# Altium schematic symbol library LimeMicroAltiumLib.SchLib: 590 symbols (part 12 of 13) (continued)
## SW_SM_4bit
designator SW?, comment 4 bit switch
Manufacturer Part Number 1: A6H-4101; Manufacturer: Omron Electronics Inc-EMC Div; Pitch: 0.050" (1.27mm), Half; Mechanical Life: 1,000 Cycles; Washable: No; Current Rating: 25mA; Number of Positions: 4; Voltage Rating: 24VDC; Actuator Level: Flush, Recessed; Circuit: SPST; Actuator Type: Slide (Standard); Supplier 1: Digi-Key; Height Above Board: 0.061" (1.55mm); RoHS: RoHS Compliant; Termination Style: Gull Wing; Electrical Life: 1,000 Cycles; Length: 0.248" (6.31mm); Category: Switches; Operating Temperature: -20°C ~ 70°C; Body Material: -; Contact Material: -; Features: -; Mounting Type: Surface Mount; Contact Finish: -; Packaging: Tube; Supplier Part Number 1: SW1080-ND
footprint SW_4WAY_SMD_1P27 (DIP Switch; 8 Leads, 1.27 pitch)
pins: 1 A1, 2 A2, 3 A3, 4 A4, 5 B4, 6 B3, 7 B2, 8 B1

## SW_SM_4bit_v2
designator SW?, comment 4 bit switch
Part Description: Dip Switch SPST Position Through Hole, Right Angle Piano Actuator 25mA 24VDC; Manufacturer: CUI Devices; Manufacturer Part Number 1: DS02C-254-1L-04BE; Supplier 1: Digi-Key; Supplier Part Number 1: 2223-DS02C-254-1L-04BE-ND; Stock 1: 1133; Pricing 1: 1=0,60000, 10=0,58100, 25=0,55920, 100=0,48400, 250=0,44100, 500=0,40874, 1000=0,36572, 2500=0,34636, 5000=0,32054 (USD); RoHS: Yes
footprint DS02C-254-1L-04BE_DIP_SWITCH_4PIN
pins: 1 A1, 2 B1, 3 A2, 4 B2, 5 A3, 6 B3, 7 A4, 8 B4

## SW_SM_8bit
designator SW?, comment 8 bit switch
Manufacturer: Omron Electronics Inc-EMC Div; Manufacturer Part Number: A6H-8101; Actuator Level: Flush; Actuator Type: Standard; Circuit: SPST; Contact Rating @ Voltage: 0.025A @ 24VDC; Number of Positions: 8; Supplier 1: Digi-Key; Mounting Type: Surface Mount; Category: Switches; Supplier Part Number 1: SW1118-ND
footprint SW_8WAY_SMD (DIP Switch; 16 Leads)
pins: 1 A1, 2 A2, 3 A3, 4 A4, 5 A5, 6 A6, 7 A7, 8 A8, 9 B8, 10 B7, 11 B6, 12 B5, 13 B4, 14 B3, 15 B2, 16 B1

## SW_THD_SPDT_On-On
designator S?, comment ON-ON
Switch THD vertical toggle SPDT; Manufacturer 1: TE Connectivity; Manufacturer Part Number 1: SLS121PC04; Contact Rating @ Voltage: 0.25A @ 125VAC; Circuit: SPDT; Mounting Type: PCB mount; Supplier 1: Digi-Key; Supplier Part Number 1: 450-1598-ND; Switch Function: On-On
footprint SWITCH_SPDT_SLIDER (TE Connectivity SLS121PC04 SPDT slider)
footprint SWITCH_SPDT_SLIDER (TE Connectivity SLS121PC04 SPDT slider)
pins: 1, 2, 3

## SW_THD_SPDT_On-On_v2
designator S?, comment ON-ON  (value not drawn)
Switch THD vertical toggle SPDT; Manufacturer Part Number: 1101M2S3CQE2; Manufacturer: C&K Components; Voltage Rating - AC: 120V; Actuator Length: 5.08mm; Current Rating: 6A (AC/DC); Electrical Life: 40,000 Cycles; Switch Travel: 2.16mm; Voltage Rating - DC: 28V; Supplier 1: Digi-Key; Termination Style: PC Pin; Operating Temperature: -30°C ~ 65°C; Category: Switches; Switch Function: On-On; Supplier Part Number 1: CKN5001-ND
footprint SWITCH_SPDT_SLIDER - duplicate (TE Connectivity SLS121PC04 SPDT slider)
pins: 1, 2, 3

## SXBP-29+
designator IC?
Manufacturer: MiniCircuits; Part Description: Bandpass Filter;  50Ω; 24 to 35 MHz; Low insertion loss (0.9dB typical); Manufacturer Part Number 1: SXBP-29+; Supplier Part Number 1: SXBP-29+; Supplier 1: Minicircuits
footprint SXBP-29+
pins: 1 IN (in), 2 GND, 3 GND, 4 GND, 5 GND, 6 GND, 7 GND, 8 OUT (out)

## SYD-20-33+_coupler
designator IC?, comment SYD-20-33+
Directional RF coupler 30 to 3000 MHz
footprint SYD-20-33+
pins: 1 OUT (out), 2 GND, 3 GND, 4 GND, 5 COUPLED OUT (out), 6 GND, 7 GND, 8 IN (in)

## SZA3044Z
designator IC?
Manufacturer: RFMD; Manufacturer Part Number 1: SZA-3044Z; Part Description: RF Amplifier IC 802.16/WiMax, WLL 2.7GHz ~ 3.8GHz 20-QFN (4x4); Gain: 26dB; Frequency: 3.8GHz; P1dB: 30dBm; Noise Figure: 5dB; Operating Supply Current: 240mA; Test Frequency: 3.6GHz; Supplier 1: Digi-Key; Stock 1: 2697; Pricing 1: 1=8,64000, 10=7,92300, 25=7,20320, 100=6,48270, 250=5,94248, 500=5,40226, 1000=4,86203 (USD); RoHS: Yes; Case/Package: QFN; Package Quantity: 1; Packaging: Tape and Reel; ComponentLink1URL: https://datasheet.ciiva.com/26924/sza-3044z-26924889.pdf?src-supplier=IIIC; ComponentLink1Description: https://datasheet.ciiva.com/26924/sza-3044z-26924889.pdf?src-supplier=IIIC; ComponentLink2URL: https://datasheet.ciiva.com/2790/sza3044z-data-sheet-2790248.pdf?src-supplier=Digi-Key; ComponentLink2Description: https://datasheet.ciiva.com/2790/sza3044z-data-sheet-2790248.pdf?src-supplier=Digi-Key; ComponentLink3URL: https://datasheet.ciiva.com/2790/sza3044z-data-sheet-2790249.pdf?src-supplier=Digi-Key; ComponentLink3Description: https://datasheet.ciiva.com/2790/sza3044z-data-sheet-2790249.pdf?src-supplier=Digi-Key; ComponentLink4URL: https://datasheet.ciiva.com/2790/sza3044z-data-sheet-2790250.pdf?src-supplier=Digi-Key; ComponentLink4Description: https://datasheet.ciiva.com/2790/sza3044z-data-sheet-2790250.pdf?src-supplier=Digi-Key; Supplier Part Number 1: 599-1071-1-ND
footprint SZA3044Z_QFN20 (Footprint not found)
pins: 1 NC, 2 NC, 3 RF IN (in), 4 NC, 5 NC, 6 VPC1 (power), 7 NC, 8 VPC2 (power), 9 NC, 10 VDET (out), 11 NC, 12 RF OUT (out), 13 NC, 14 RF OUT (out), 15 NC, 16 VC2 (power), 17 NC, 18 VC1 (power), 19 NC, 20 VBIAS (power), EPAD GND

## TC1-1-13M+
designator T?
Part Description: RF balun; 1:1 ratio; 3 dB bandwidth: 0.1 MHz to 3.5 GHz; 3.8mm x 3.8mm; Supplier 1: Minicircuits; Manufacturer Part Number 1: TC1-1-13M+; Supplier Part Number: TC1-1-13M+
footprint TC1-1-13MA+_v2 (Balun)
pins: 1, 2, 3, 4, 6
text: Primary; Secondary; 1:1

## TC1-1-13M+_TCM1-63AX+
designator T?, comment TC1-1-13M-45+
Part Description: RF balun; 1:1 ratio; 3 dB bandwidth: 0.1 MHz to 3.5 GHz; 3.8mm x 3.8mm; Supplier 1: Minicircuits; Manufacturer Part Number 1: TC1-1-13M-45+; Supplier Part Number: TC1-1-13M-45+
footprint TC1-1-13MA+_JA4220-AL_TCM1-63AX+ (Balun compatible with TC1-1-13MA+, JA4220-AL_ and TCM1-63AX+)
pins: 1, 2, 3, 4, 6
text: Primary; Secondary; 1:1; TCM1-63AX+

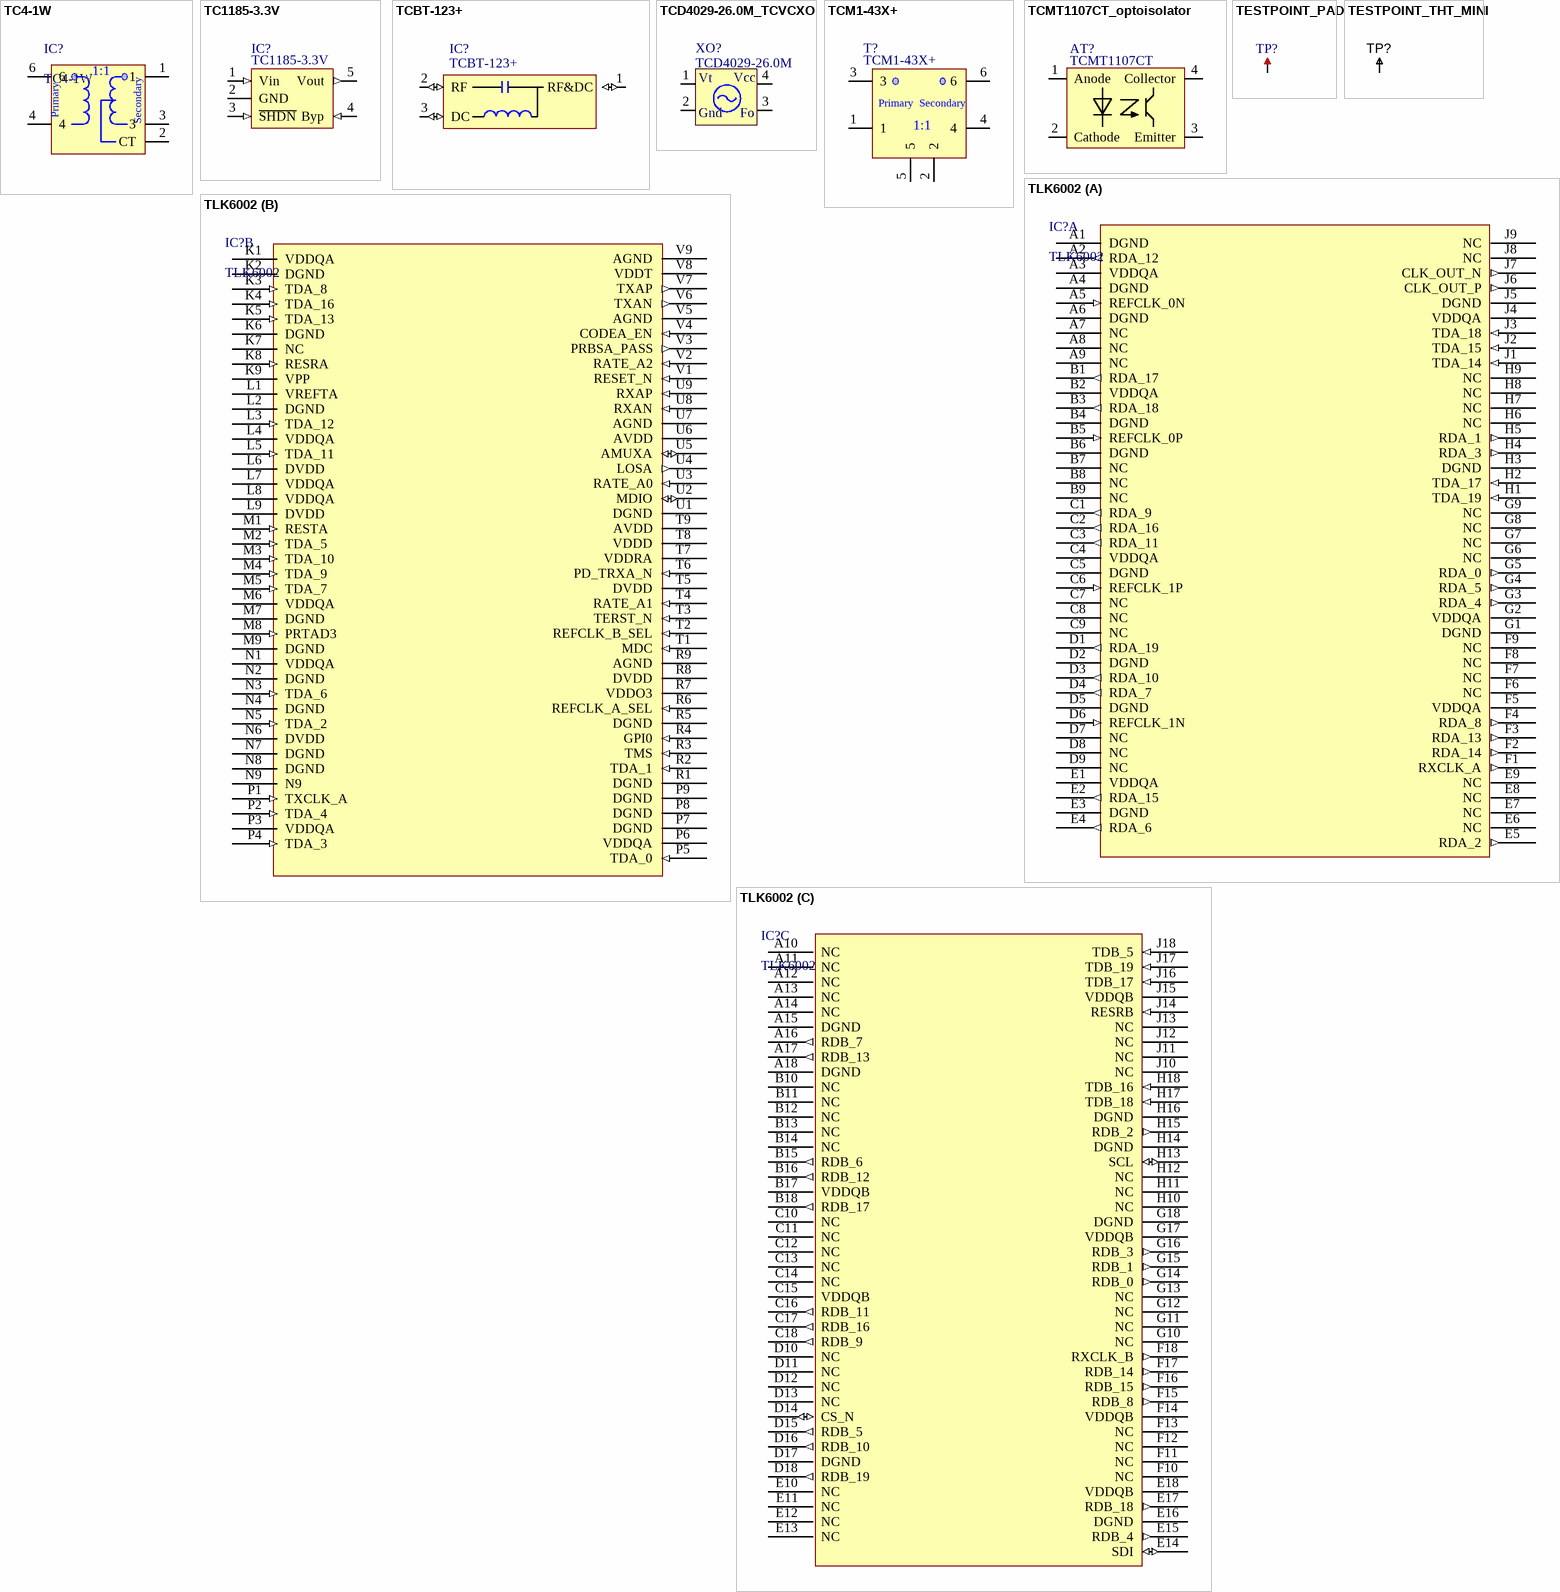
[diagram p65: symbols TC4-1W to TLK6002]

## TC4-1W
designator IC?
Part Description: RF Transformer; 50R, 3 to 800 MHz; with secondary center tap; Manufacturer: Mini-CIrcuits; Manufacturer Part Number 1: TC4-1W; Supplier Part Number 1: TC4-1W; Supplier 1: Mini-Circuits
footprint TC1-1-13MA+_JA4220-AL_ (Balun compatible with TC1-1-13MA+ and JA4220-AL_)
pins: 1, 2 CT, 3, 4, 6
text: 1:1; Primary; Secondary

## TC1185-3.3V
designator IC?
Part Description: IC REG LDO 3.3V 0.15A SOT23-5; Manufacturer: Microchip Technology; Manufacturer Part Number 1: TC1185-3.3VCT713; Regulator Topology: Positive Fixed; Voltage - Output: 3.3V; Current - Output: 150mA; Voltage - Dropout (Typical): 0.27V @ 150mA; Voltage - Input: Up to 6V; Supplier 1: Digi-Key; RoHS: RoHS Compliant; Category: Integrated Circuits (ICs); Stock 1: 24034; Pricing 1: 1=0.38, 25=0.3192, 100=0.2884 (USD); Packaging: Cut Tape (CT); Part Status: Active; Current - Limit (Min): -; Operating Temperature: -40°C ~ 125°C; Mounting Type: Surface Mount; Package / Case: SC-74A, SOT-753; Supplier Device Package: SOT-23-5; ComponentLink1URL: http://www.microchip.com/mymicrochip/filehandler.aspx?ddocname=en011417; ComponentLink1Description: http://www.microchip.com/mymicrochip/filehandler.aspx?ddocname=en011417; Supplier Part Number 1: TC11853.3VCT713CT-ND
footprint SOT23-5
pins: 1 Vin (in), 2 GND, 3 ~{SHDN} (in), 4 Byp (in), 5 Vout (out)

## TCBT-123+
designator IC?
Surface mount bias-tee, wideband; Manufacturer_Name: Mini-Circuits; Manufacturer_Part_Number: TCBT-14+; Supplier Part Number 1: TCBT-14+; Supplier 1: Mini-Circuits; Part Description: Surface mount bias-tee, wideband
footprint TCBT-123+_GU1414
pins: 1 RF&DC (io), 2 RF (io), 3 DC (io), 4 NOT_USED hidden, 5 PAD_1 hidden, 6 PAD_2 hidden

## TCD4029-26.0M_TCVCXO
designator XO?, comment TCD4029-26.0M
pins: 1 Vt (power), 2 GND, 3 Fo, 4 VCC (power)
text: Vcc; Gnd

## TCM1-43X+
designator T?
Also compatible with JA4220-AL_; Part Description: RF balun; 1:1 ratio; 3 dB bandwidth: 10 MHz to 4 GHz; 3.8mm x 3.8mm; Supplier 1: Coilcraft; Manufacturer Part Number 1: TCM1-43X+; Supplier Part Number: TCM1-43X+
footprint TCM1-43X+ (Balun)
pins: 1, 2, 3, 4, 5, 6
text: Primary; Secondary; 1:1

## TCMT1107CT_optoisolator
designator AT?, comment TCMT1107CT
Part Description: Optoisolator Transistor Output 5000Vrms 1 Channel 4-SMD; Manufacturer: Vishay Semiconductors; Reverse Breakdown Voltage: 6V; Max Power Dissipation: 250mW; Number of Channels: 1; Output Voltage: 70V; Forward Voltage: 1.6V; Forward Current: 60mA; Rise Time: 3s; Output Current per Channel: 50mA; Collector Emitter Saturation Voltage: 300mV; Isolation Voltage: 3.75kV; Fall Time: 4.7s; Current Transfer Ratio: 160%; ComponentLink1URL: https://www.verical.com/server-webapp/html/getDatasheet?partID=312696; ComponentLink1Description: https://www.verical.com/server-webapp/html/getDatasheet?partID=312696; ComponentLink2URL: https://www.fairchildsemi.com/datasheets/FO/FOD817A.pdf; ComponentLink2Description: https://www.fairchildsemi.com/datasheets/FO/FOD817A.pdf; ComponentLink3URL: http://www.fairchildsemi.com/ds/FO/FOD817A.pdf; ComponentLink3Description: http://www.fairchildsemi.com/ds/FO/FOD817A.pdf; ComponentLink4URL: http://www.fairchildsemi.com/datasheets/FO/FOD817A.pdf; ComponentLink4Description: http://www.fairchildsemi.com/datasheets/FO/FOD817A.pdf; ComponentLink5URL: http://www.mouser.com/ds/2/149/FOD817A-194238.pdf; ComponentLink5Description: http://www.mouser.com/ds/2/149/FOD817A-194238.pdf; ComponentLink6URL: https://www.fairchildsemi.com/datasheets/FO/FOD817D.pdf; ComponentLink6Description: https://www.fairchildsemi.com/datasheets/FO/FOD817D.pdf; Supplier 1: Digi-Key; Manufacturer Part Number 1: TCMT1107; Stock 1: 139303; Pricing 1: 1=0.75, 10=0.585, 25=0.4848, 100=0.418, 250=0.36784, 500=0.31768, 1000=0.2508 (USD); Mount: PCB,Surface Mount; Case/Package: SOP; Number of Pins: 4; Contact Plating: Matte,Tin; Min Operating Temperature: -40°C; Max Operating Temperature: 100°C; Packaging: Tape and Reel; Package Quantity: 1; Collector Emitter Voltage (VCEO): 70V; Max Output Voltage: 70V; Max Collector Current: 50mA; Reverse Voltage (DC): 6V; Number of Elements: 1; Power Dissipation: 250mW; Max Input Current: 60mA; Collector Emitter Breakdown Voltage: 70V; Input Current: 50mA; Voltage Rating (DC): 70V; Voltage: 6V; Radiation Hardening: No; REACH SVHC: No SVHC; Lead Free: Lead Free; ComponentLink7URL: http://www.jameco.com/Jameco/Products/ProdDS/1107109.pdf; ComponentLink7Description: http://www.jameco.com/Jameco/Products/ProdDS/1107109.pdf; ComponentLink8URL: http://www.vishay.com/docs/83510/tcmt1100.pdf; ComponentLink8Description: http://www.vishay.com/docs/83510/tcmt1100.pdf; ComponentLink9URL: http://www.mouser.com/ds/2/427/tcmt1100-103040.pdf; ComponentLink9Description: http://www.mouser.com/ds/2/427/tcmt1100-103040.pdf; ComponentLink10URL: http://www.farnell.com/datasheets/485045.pdf; ComponentLink10Description: http://www.farnell.com/datasheets/485045.pdf; Supplier Part Number 1: TCMT1107CT-ND
footprint TCMT1107CT_optoisolator
pins: 1 Anode, 2 Cathode, 3 Emitter, 4 Collector

## TESTPOINT_PAD
designator TP?  (value not drawn)  (no BOM)
Test Point PCB mount Miniature White
pins: 1

## TESTPOINT_THT_MINI
designator TP?  (value not drawn)
Test Point PCB mount Miniature White; Manufacturer 1: Keystone Electronics; Manufacturer Part Number 1: 5002; Mounting Type: 0.040" (1.0mm) Hole Diameter; Material: Base, Nylon 46, UL 94V-0; Supplier 1: Digi-Key; Supplier Part Number 1: 5002K-ND
footprint TP-THT-MINI (Thru-hole test point loop)
pins: 1

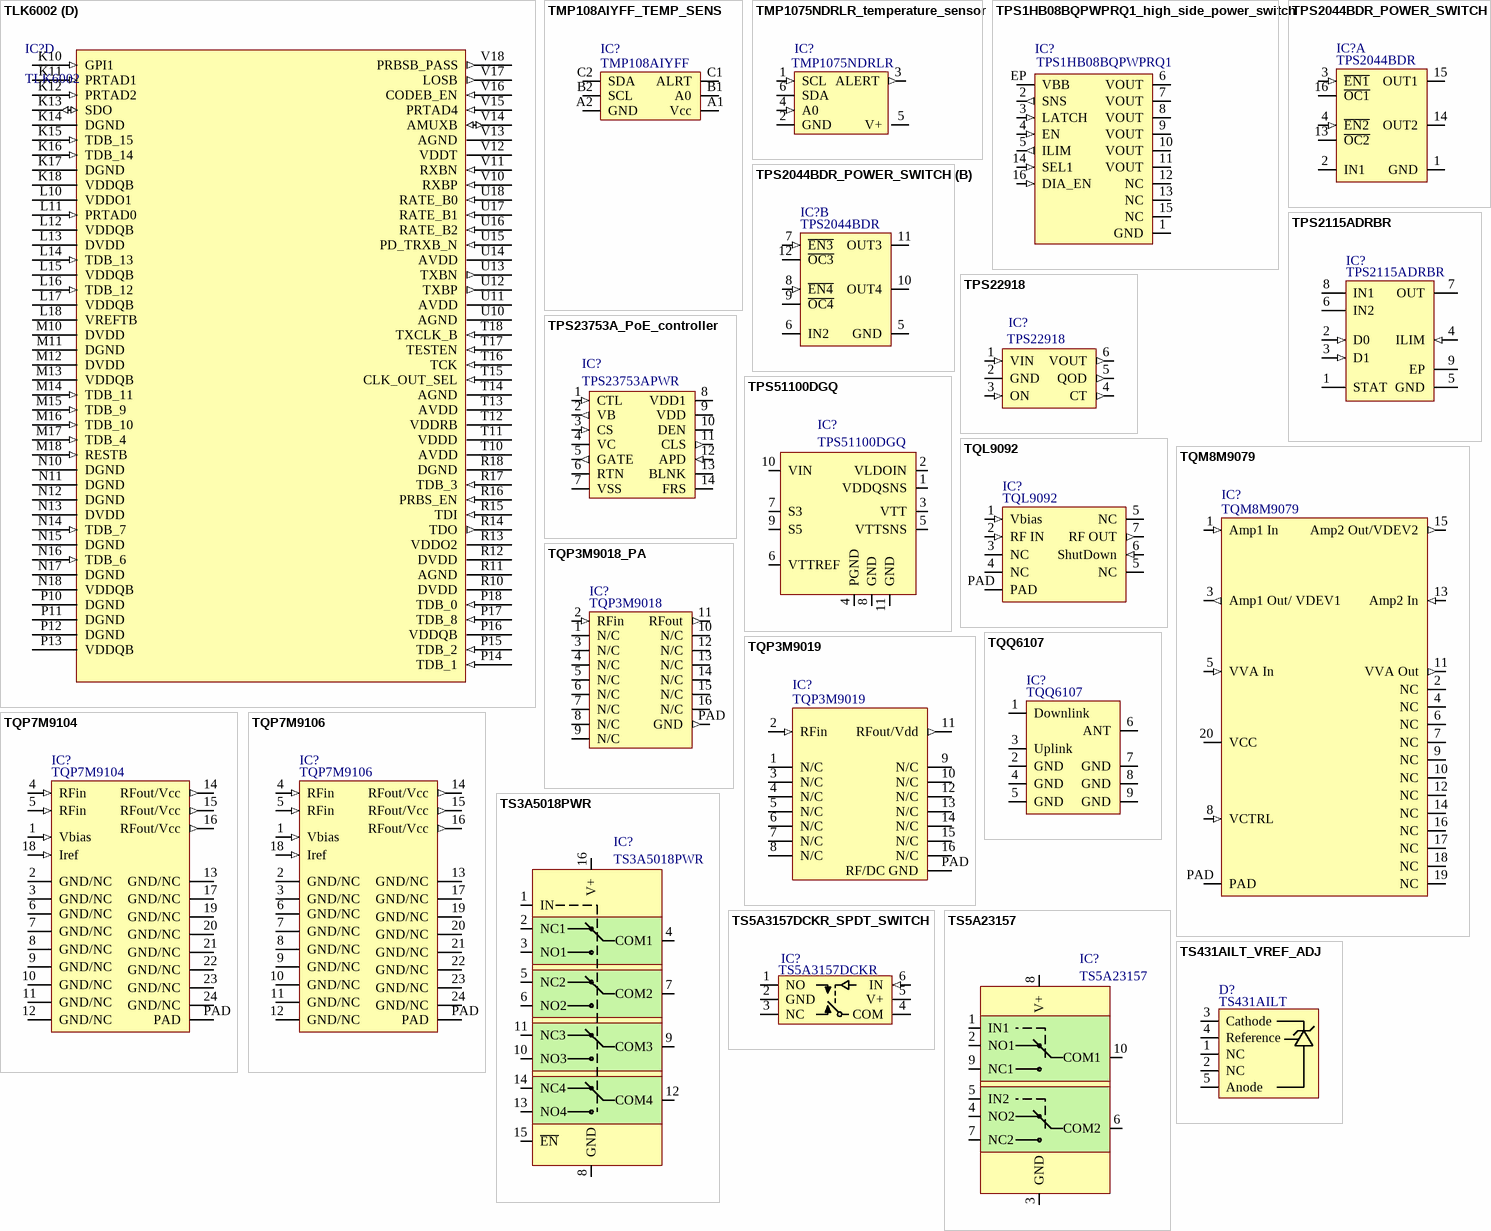
[diagram p66: symbols TLK6002 to TS431AILT_VREF_ADJ]

## TLK6002
designator IC?
Manufacturer: Texas Instruments; Manufacturer Part Number: TLK6002ZEU; Voltage - Supply: 1.5 V, 1.8 V; Number of Drivers/Receivers: 2/2; Duplex: Full; Protocol: Gigabit Ethernet; Supplier 1: Digi-Key; Type: Transceiver; Packaging: Tray; RoHS: RoHS Compliant; Category: Integrated Circuits (ICs); Operating Temperature: -40°C ~ 85°C; Mounting Type: Surface Mount; Package / Case: 324-BGA; Supplier Device Package: 324-BGA; Data Rate: -; Receiver Hysteresis: -; Supplier Part Number 1: 296-27459-5-ND
footprint TLK6002
part A pins: A1 DGND (power), A2 RDA_12 (out), A3 VDDQA (power), A4 DGND (power), A5 REFCLK_0N (in), A6 DGND (power), A7 NC, A8 NC, A9 NC, B1 RDA_17 (out), B2 VDDQA (power), B3 RDA_18 (out), B4 DGND (power), B5 REFCLK_0P (in), B6 DGND (power), B7 NC, B8 NC, B9 NC, C1 RDA_9 (out), C2 RDA_16 (out), C3 RDA_11 (out), C4 VDDQA (power), C5 DGND (power), C6 REFCLK_1P (in), C7 NC, C8 NC, C9 NC, D1 RDA_19 (out), D2 DGND (power), D3 RDA_10 (out), D4 RDA_7 (out), D5 DGND (power), D6 REFCLK_1N (in), D7 NC, D8 NC, D9 NC, E1 VDDQA (power), E2 RDA_15 (out), E3 DGND (power), E4 RDA_6 (out), E5 RDA_2 (out), E6 NC, E7 NC, E8 NC, E9 NC, F1 RXCLK_A (out), F2 RDA_14 (out), F3 RDA_13 (out), F4 RDA_8 (out), F5 VDDQA (power), F6 NC, F7 NC, F8 NC, F9 NC, G1 DGND (power), G2 VDDQA (power), G3 RDA_4 (out), G4 RDA_5 (out), G5 RDA_0 (out), G6 NC, G7 NC, G8 NC, G9 NC, H1 TDA_19 (in), H2 TDA_17 (in), H3 DGND (power), H4 RDA_3 (out), H5 RDA_1 (out), H6 NC, H7 NC, H8 NC, H9 NC, J1 TDA_14 (in), J2 TDA_15 (in), J3 TDA_18 (in), J4 VDDQA (power), J5 DGND (power), J6 CLK_OUT_P (out), J7 CLK_OUT_N (out), J8 NC, J9 NC
part B pins: K1 VDDQA (power), K2 DGND (power), K3 TDA_8 (in), K4 TDA_16 (in), K5 TDA_13 (in), K6 DGND (power), K7 NC, K8 RESRA (in), K9 VPP (power), L1 VREFTA (power), L2 DGND (power), L3 TDA_12 (in), L4 VDDQA (power), L5 TDA_11 (in), L6 DVDD (power), L7 VDDQA (power), L8 VDDQA (power), L9 DVDD (power), M1 RESTA (in), M2 TDA_5 (in), M3 TDA_10 (in), M4 TDA_9 (in), M5 TDA_7 (in), M6 VDDQA (power), M7 DGND (power), M8 PRTAD3 (in), M9 DGND (power), N1 VDDQA (power), N2 DGND (power), N3 TDA_6 (in), N4 DGND (power), N5 TDA_2 (in), N6 DVDD (power), N7 DGND (power), N8 DGND (power), N9, P1 TXCLK_A (in), P2 TDA_4 (in), P3 VDDQA (power), P4 TDA_3 (in), P5 TDA_0 (in), P6 VDDQA (power), P7 DGND (power), P8 DGND (power), P9 DGND (power), R1 DGND (power), R2 TDA_1 (in), R3 TMS (in), R4 GPI0 (in), R5 DGND (power), R6 REFCLK_A_SEL (in), R7 VDDO3 (power), R8 DVDD (power), R9 AGND (power), T1 MDC (in), T2 REFCLK_B_SEL (in), T3 TERST_N (in), T4 RATE_A1 (in), T5 DVDD (power), T6 PD_TRXA_N (in), T7 VDDRA (power), T8 VDDD (power), T9 AVDD (power), U1 DGND (power), U2 MDIO (io), U3 RATE_A0 (in), U4 LOSA (out), U5 AMUXA (io), U6 AVDD (power), U7 AGND (power), U8 RXAN (in), U9 RXAP (in), V1 RESET_N (in), V2 RATE_A2 (in), V3 PRBSA_PASS (out), V4 CODEA_EN (in), V5 AGND (power), V6 TXAN (out), V7 TXAP (out), V8 VDDT (power), V9 AGND (power)
part C pins: A10 NC, A11 NC, A12 NC, A13 NC, A14 NC, A15 DGND (power), A16 RDB_7 (out), A17 RDB_13 (out), A18 DGND (power), B10 NC, B11 NC, B12 NC, B13 NC, B14 NC, B15 RDB_6 (out), B16 RDB_12 (out), B17 VDDQB (power), B18 RDB_17 (out), C10 NC, C11 NC, C12 NC, C13 NC, C14 NC, C15 VDDQB (power), C16 RDB_11 (out), C17 RDB_16 (out), C18 RDB_9 (out), D10 NC, D11 NC, D12 NC, D13 NC, D14 CS_N (io), D15 RDB_5 (out), D16 RDB_10 (out), D17 DGND (power), D18 RDB_19 (out), E10 NC, E11 NC, E12 NC, E13 NC, E14 SDI (io), E15 RDB_4 (out), E16 DGND (power), E17 RDB_18 (out), E18 VDDQB (power), F10 NC, F11 NC, F12 NC, F13 NC, F14 VDDQB (power), F15 RDB_8 (out), F16 RDB_15 (out), F17 RDB_14 (out), F18 RXCLK_B (out), G10 NC, G11 NC, G12 NC, G13 NC, G14 RDB_0 (out), G15 RDB_1 (out), G16 RDB_3 (out), G17 VDDQB (power), G18 DGND (power), H10 NC, H11 NC, H12 NC, H13 SCL (io), H14 DGND (power), H15 RDB_2 (out), H16 DGND (power), H17 TDB_18 (in), H18 TDB_16 (in), J10 NC, J11 NC, J12 NC, J13 NC, J14 RESRB (in), J15 VDDQB (power), J16 TDB_17 (in), J17 TDB_19 (in), J18 TDB_5 (in)
part D pins: K10 GPI1 (in), K11 PRTAD1 (in), K12 PRTAD2 (in), K13 SDO (io), K14 DGND (power), K15 TDB_15 (in), K16 TDB_14 (in), K17 DGND (power), K18 VDDQB (power), L10 VDDO1 (power), L11 PRTAD0 (in), L12 VDDQB (power), L13 DVDD (power), L14 TDB_13 (in), L15 VDDQB (power), L16 TDB_12 (in), L17 VDDQB (power), L18 VREFTB (power), M10 DVDD (power), M11 DGND (power), M12 DVDD (power), M13 VDDQB (power), M14 TDB_11 (in), M15 TDB_9 (in), M16 TDB_10 (in), M17 TDB_4 (in), M18 RESTB (in), N10 DGND (power), N11 DGND (power), N12 DGND (power), N13 DVDD (power), N14 TDB_7 (in), N15 DGND (power), N16 TDB_6 (in), N17 DGND (power), N18 VDDQB (power), P10 DGND (power), P11 DGND (power), P12 DGND (power), P13 VDDQB (power), P14 TDB_1 (in), P15 TDB_2 (in), P16 VDDQB (power), P17 TDB_8 (in), P18 TDB_0 (in), R10 DVDD (power), R11 AGND (power), R12 DVDD (power), R13 VDDO2 (power), R14 TDO (out), R15 TDI (in), R16 PRBS_EN (in), R17 TDB_3 (in), R18 DGND (power), T10 AVDD (power), T11 VDDD (power), T12 VDDRB (power), T13 AVDD (power), T14 AGND (power), T15 CLK_OUT_SEL (in), T16 TCK (in), T17 TESTEN (in), T18 TXCLK_B (in), U10 AGND (power), U11 AVDD (power), U12 TXBP (out), U13 TXBN (out), U14 AVDD (power), U15 PD_TRXB_N (in), U16 RATE_B2 (in), U17 RATE_B1 (in), U18 RATE_B0 (in), V10 RXBP (in), V11 RXBN (in), V12 VDDT (power), V13 AGND (power), V14 AMUXB (io), V15 PRTAD4 (in), V16 CODEB_EN (in), V17 LOSB (out), V18 PRBSB_PASS (out)

## TMP108AIYFF_TEMP_SENS
designator IC?, comment TMP108AIYFF
Part Description: Temperature Sensor Digital, Local -40°C ~ 125°C 12 b 6-DSBGA; Manufacturer: Texas Instruments; Manufacturer Part Number 1: TMP108AIYFFR; Interface: I2C,SMBus,2-Wire; Min Supply Voltage: 1.4V; Max Supply Voltage: 3.6V; Nominal Supply Current: 12uA; Resolution: 12b; Quiescent Current: 6uA; Output Type: Digital; Supplier 1: Digi-Key; Supplier Part Number 1: 296-39295-1-ND; Stock 1: 0; RoHS: Yes; Mount: Surface Mount; Number of Pins: 6; Min Operating Temperature: -40°C; Max Operating Temperature: 125°C; Package Quantity: 3000; Packaging: Tape and Reel; Radiation Hardening: No; Lead Free: Lead Free; RoHS Compliant: Yes; ComponentLink1URL: https://datasheet.ciiva.com/46636/tmp108-46636604.pdf?src-supplier=Digi-Key; ComponentLink1Description: https://datasheet.ciiva.com/46636/tmp108-46636604.pdf?src-supplier=Digi-Key; ComponentLink2URL: https://datasheet.ciiva.com/29895/tmp108-29895365.pdf?src-supplier=Avnet; ComponentLink2Description: https://datasheet.ciiva.com/29895/tmp108-29895365.pdf?src-supplier=Avnet
footprint TMP108AIYFF_TEMP_SENS_6DSBGA (Footprint not found)
pins: A1 Vcc, A2 GND, B1 A0, B2 SCL, C1 ALRT, C2 SDA

## TMP1075NDRLR_temperature_sensor
designator IC?, comment TMP1075NDRLR
Part Description: Temperature Sensor Digital, Local -40°C ~ 125°C 12 b SOT-563; Manufacturer: Texas Instruments; Supplier 1: Digi-Key; Supplier Part Number 1: 296-TMP1075NDRLRCT-ND; Manufacturer Part Number 1: TMP1075NDRLR; Stock 1: 3405; Pricing 1: 1=0,67000, 5=0,63800, 10=0,55500, 25=0,48760, 50=0,40500, 100=0,34500, 500=0,30000, 1000=0,26250 (USD); RoHS: No; RoHS Compliant: Yes
footprint TMP1075NDRLR_temperature_sensor_SOT563
pins: 1 SCL (in), 2 GND, 3 ALERT (out), 4 A0 (in), 5 V+ (power), 6 SDA (io)

## TPS1HB08BQPWPRQ1_high_side_power_switch
designator IC?, comment TPS1HB08BQPWPRQ1
Part Description: Power Switch/Driver 1:1 N-Channel 70A 16-HTSSOP; Manufacturer: Texas Instruments; Supplier 1: Digi-Key; Supplier Part Number 1: 296-TPS1HB08BQPWPRQ1CT-ND; Manufacturer Part Number 1: TPS1HB08BQPWPRQ1; Stock 1: 2997; Pricing 1: 1=2,82000, 10=2,53100, 25=2,38760, 100=1,91000, 250=1,67124, 500=1,62350, 1000=1,28925 (USD); ComponentLink1URL: https://octopart.com/click/track?ai=10049&ct=datasheets&sig=08afd74&at=physicalpart&sid=370&ppid=102282400&hlid=30197904&src-supplier=TI+store; ComponentLink1Description: https://octopart.com/click/track?ai=10049&ct=datasheets&sig=08afd74&at=physicalpart&sid=370&ppid=102282400&hlid=30197904&src-supplier=TI+store; ComponentLink2URL: http://sigma.octopart.com/77689632/technical_drawing/Texas-Instruments-TPS1HB08BQPWPRQ1.pdf?src-supplier=TI+store; ComponentLink2Description: http://sigma.octopart.com/77689632/technical_drawing/Texas-Instruments-TPS1HB08BQPWPRQ1.pdf?src-supplier=TI+store
footprint TPS1HB08BQPWPRQ1_TSSOP16
pins: 1 GND, 2 SNS (out), 3 LATCH (in), 4 EN (in), 5 ILIM (out), 6 VOUT, 7 VOUT, 8 VOUT, 9 VOUT, 10 VOUT, 11 VOUT, 12 NC, 13 NC, 14 SEL1 (in), 15 NC, 16 DIA_EN (in), EP VBB
